# Altium footprint library HW_HOLLAND_NCDM_MONITOR_R1.PcbLib: 472 footprints (part 5 of 30)
Each footprint in its own frame and in the unit in brackets; x right, y up, seen from the top. Pads: shape width x height; smd on the part's side, far side on the other; paste and mask are expansions set on the pad; w line width, h text height; cw(c..) or ccw(c..) is an arc to the next point about the centre after c.
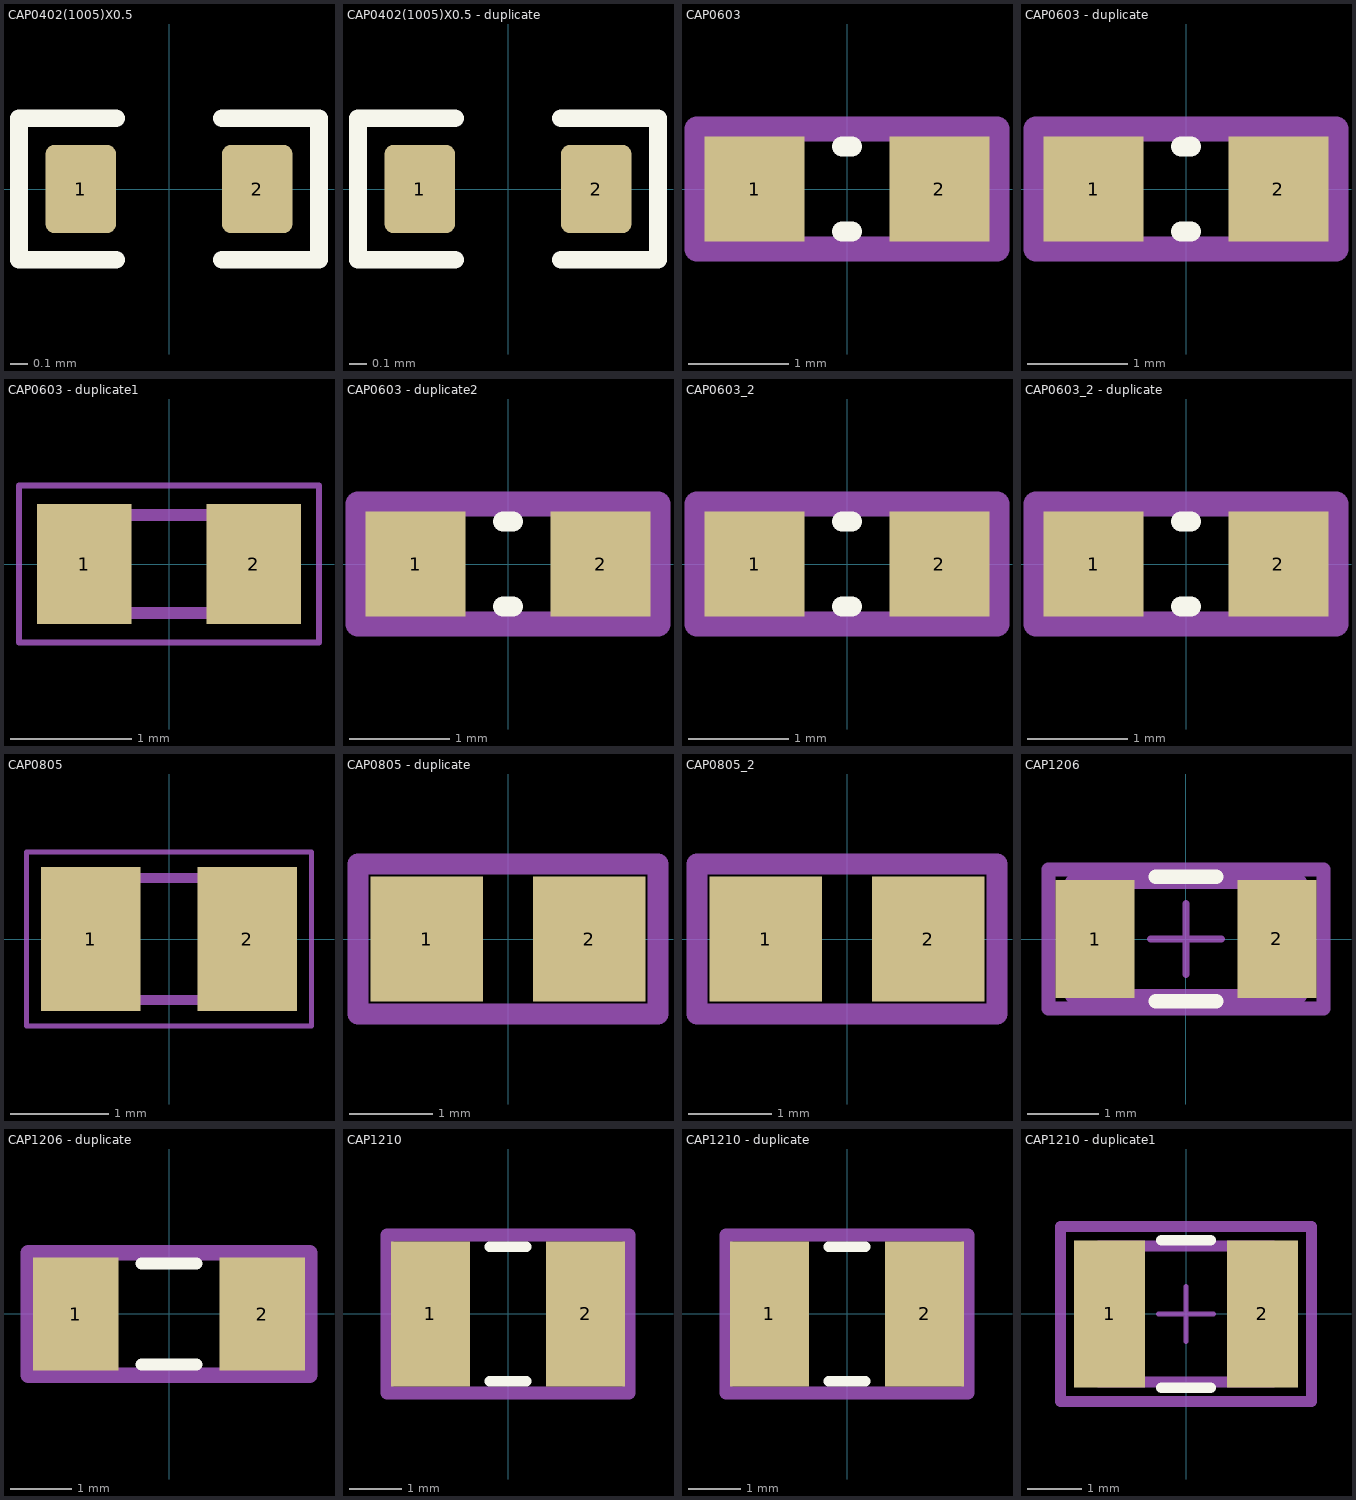
[diagram p4: the footprints below, top view; thin cyan lines are the x and y axes]

## CAP0402(1005)X0.5 [mm]
pads (2):
  rrect25% 0.4x0.5 smd mask+0.102: 1(-0.5,0) 2(0.5,0)
Top Overlay:
  lines w0.1: -0.3,-0.4 -0.85,-0.4 -0.85,0.4 -0.3,0.4 ; 0.3,-0.4 0.85,-0.4 0.85,0.4 0.3,0.4
3D body "Cap 0402(1005)x50N.STEP": height 0.51, standoff 0, extent -0.5,-0.25 0.5,0.25

## CAP0402(1005)X0.5 - duplicate [mm]
pads (2):
  rrect25% 0.4x0.5 smd mask+0.102: 1(-0.5,0) 2(0.5,0)
Top Overlay:
  lines w0.1: -0.3,-0.4 -0.85,-0.4 -0.85,0.4 -0.3,0.4 ; 0.3,-0.4 0.85,-0.4 0.85,0.4 0.3,0.4
3D body "Cap 0402(1005)x50N.STEP": height 0.51, standoff 0, extent -0.5,-0.25 0.5,0.25

## CAP0603 [mm] "CAPACITOR 0603"
height 0.8
pads (2):
  rect 1x1.05 smd: 1(-0.925,0) 2(0.925,0)
Top Overlay:
  lines w0.2: -0.05,-0.425 0.05,-0.425 ; -0.05,0.425 0.05,0.425
Top Designator:
  lines w0.254: -1.5,-0.6 1.5,-0.6 1.5,0.6 -1.5,0.6 -1.5,-0.6
  text "'.Designator'" at -4.317,-0.317 h0.76
3D body "CAP0603.step": height 0.8, standoff 0, extent -0.8,-0.4 0.8,0.4

## CAP0603 - duplicate [mm] "CAPACITOR 0603"
height 0.8
pads (2):
  rect 1x1.05 smd: 1(-0.925,0) 2(0.925,0)
Top Overlay:
  lines w0.2: -0.05,-0.425 0.05,-0.425 ; -0.05,0.425 0.05,0.425
Top Designator:
  lines w0.254: -1.5,-0.6 1.5,-0.6 1.5,0.6 -1.5,0.6 -1.5,-0.6
  text "'.Designator'" at -4.317,-0.317 h0.76
3D body "CAP0603.step": height 0.8, standoff 0, extent -0.8,-0.4 0.8,0.4

## CAP0603 - duplicate1 [mm]
pads (2):
  rect 0.78x0.99 smd: 1(-0.7,0) 2(0.7,0)
Mechanical 13:
  lines w0.1: -0.8,-0.405 0.8,-0.405 0.8,0.405 -0.8,0.405 -0.8,-0.405
Mechanical 15:
  lines w0.05: -1.24,-0.65 1.24,-0.65 1.24,0.65 -1.24,0.65 -1.24,-0.65
3D body "06032U6R8BAT2A.stp": height 0.9, standoff 0, extent -0.8,-0.405 0.8,0.405

## CAP0603 - duplicate2 [mm]
height 3.5
pads (2):
  rect 1x1.05 smd: 1(-0.925,0) 2(0.925,0)
Top Overlay:
  lines w0.2: -0.05,-0.425 0.05,-0.425 ; -0.05,0.425 0.05,0.425
Top Designator:
  lines w0.254: -1.5,-0.6 1.5,-0.6 1.5,0.6 -1.5,0.6 -1.5,-0.6
  text "'.Designator'" at -4.317,-0.317 h0.76
3D body "CAP0603.step": height 0.8, standoff 0, extent -0.8,-0.4 0.8,0.4

## CAP0603_2 [mm]
pads (2):
  rect 1x1.05 smd: 1(-0.925,0) 2(0.925,0)
Top Overlay:
  lines w0.2: -0.05,-0.425 0.05,-0.425 ; -0.05,0.425 0.05,0.425
Top Designator:
  lines w0.254: -1.5,-0.6 -1.5,0.6 1.5,0.6 1.5,-0.6 -1.5,-0.6
  text "'.Designator'" at -3.017,-0.282 h1.25
3D body "CAP0603.step": height 0.8, standoff 0, extent -0.8,-0.4 0.8,0.4

## CAP0603_2 - duplicate [mm]
pads (2):
  rect 1x1.05 smd: 1(-0.925,0) 2(0.925,0)
Top Overlay:
  lines w0.2: -0.05,-0.425 0.05,-0.425 ; -0.05,0.425 0.05,0.425
Top Designator:
  lines w0.254: -1.5,-0.6 -1.5,0.6 1.5,0.6 1.5,-0.6 -1.5,-0.6
  text "'.Designator'" at -4.317,-0.317 h0.76
3D body "CAP0603.step": height 0.8, standoff 0, extent -0.8,-0.4 0.8,0.4

## CAP0805 [mm]
pads (2):
  rect 1.02x1.47 smd: 1(-0.8,0) 2(0.8,0)
Mechanical 13:
  lines w0.1: -1,-0.625 1,-0.625 1,0.625 -1,0.625 -1,-0.625
Mechanical 15:
  lines w0.05: -1.46,-0.89 1.46,-0.89 1.46,0.89 -1.46,0.89 -1.46,-0.89
3D body "CC0805KKX5R8BB106.stp": height 1.45, standoff 0, extent -1,-0.625 1,0.625

## CAP0805 - duplicate [mm] "CAPACITOR 0805"
height 1.4
pads (2):
  rect 1.35x1.5 smd: 1(-0.975,0) 2(0.975,0)
Top Designator:
  lines w0.254: -1.8,-0.9 -1.8,0.9 1.8,0.9 1.8,-0.9 -1.8,-0.9
  text "'.Designator'" at -5.755,-0.423 h1.02
3D body "CAP08052.step": height 1.4, standoff 0, extent -1,-0.625 1,0.625

## CAP0805_2 [mm]
pads (2):
  rect 1.35x1.5 smd: 1(-0.975,0) 2(0.975,0)
Top Designator:
  lines w0.254: -1.8,-0.9 1.8,-0.9 1.8,0.9 -1.8,0.9 -1.8,-0.9
  text "'.Designator'" at -5.755,-0.423 h1.02
3D body "CAP08052.step": height 1.4, standoff 0, extent -1,-0.625 1,0.625

## CAP1206 [mm]
pads (2):
  rect 1.105x1.658 smd paste+0 mask+0: 1(-1.276,0) 2(1.276,0)
Top Overlay:
  lines w0.2: -0.424,-0.875 0.424,-0.875 ; -0.424,0.875 0.424,0.875
Top Courtyard:
  lines w0.2: -1.929,-0.975 1.929,-0.975 1.929,0.975 -1.929,0.975 -1.929,-0.975
  text ".Designator" at 0,0.235 h1.25
Mechanical 12:
  lines w0.2: -1.6,-0.8 1.6,-0.8 1.6,0.8 -1.6,0.8 -1.6,-0.8
Mechanical 15:
  lines w0.1: -0.5,0 0.5,0 ; 0,-0.5 0,0.5
  lines w0.2: -1.929,-0.975 1.929,-0.975 1.929,0.975 -1.929,0.975 -1.929,-0.975
3D body "Cap_Samsung_CL31A475KBHNNNE_eec.STEP": height 1.4, standoff 0, extent -1.6,-0.8 1.6,0.8

## CAP1206 - duplicate [mm]
height 0.52
pads (2):
  rect 1.4x1.85 smd: 1(-1.525,0) 2(1.525,0)
Top Overlay:
  lines w0.2: -0.45,-0.825 0.45,-0.825 ; -0.45,0.825 0.45,0.825
Top Designator:
  lines w0.254: -2.3,-1 2.3,-1 2.3,1 -2.3,1 -2.3,-1
  text "'.Designator'" at -5.755,-0.423 h1.02
3D body "CAP1206.step": height 1.8, standoff 0, extent -1.6,-0.8 1.6,0.8

## CAP1210 [mm]
pads (2):
  rect 1.5x2.75 smd: 1(-1.475,0) 2(1.475,0)
Top Overlay:
  lines w0.2: -0.35,-1.275 0.35,-1.275 ; -0.35,1.275 0.35,1.275
Top Designator:
  lines w0.254: -2.3,-1.5 -2.3,1.5 2.3,1.5 2.3,-1.5 -2.3,-1.5
  text "'.Designator'" at -6.475,-0.476 h1.14
3D body "CAP1210.step": height 1.8, standoff 0, extent -1.6,-1.25 1.6,1.25

## CAP1210 - duplicate [mm]
pads (2):
  rect 1.5x2.75 smd: 1(-1.475,0) 2(1.475,0)
Top Overlay:
  lines w0.2: -0.35,-1.275 0.35,-1.275 ; -0.35,1.275 0.35,1.275
Top Designator:
  lines w0.254: -2.3,-1.5 -2.3,1.5 2.3,1.5 2.3,-1.5 -2.3,-1.5
  text "'.Designator'" at -6.475,-0.476 h1.14
3D body "CAP1210.step": height 1.8, standoff 0, extent -1.6,-1.25 1.6,1.25

## CAP1210 - duplicate1 [mm]
pads (2):
  rect 1.305x2.706 smd paste+0 mask+0: 1(-1.401,0) 2(1.401,0)
Top Overlay:
  lines w0.2: -0.448,-1.353 0.448,-1.353 ; -0.448,1.353 0.448,1.353
Top Courtyard:
  lines w0.2: -2.303,-1.603 -2.303,1.603 2.303,1.603 2.303,-1.603 -2.303,-1.603
  text ".Designator" at 0,0.235 h1.25
Mechanical 12:
  lines w0.2: -1.6,-1.25 -1.6,1.25 1.6,1.25 1.6,-1.25 -1.6,-1.25
Mechanical 15:
  lines w0.1: -0.5,0 0.5,0 ; 0,-0.5 0,0.5
  lines w0.2: -2.303,-1.603 -2.303,1.603 2.303,1.603 2.303,-1.603 -2.303,-1.603
3D body "Cap_KEMET_C1210C472KGRACTU_eec.STEP": height 0.25, standoff 0, extent -2.303,-1.603 2.303,1.603